# Altium footprint library Tomra_Cadstar_Footprints.PcbLib: 380 footprints (part 9 of 24)
Each footprint in its own frame and in the unit in brackets; x right, y up, seen from the top. Pads: shape width x height; smd on the part's side, far side on the other; paste and mask are expansions set on the pad; w line width, h text height; cw(c..) or ccw(c..) is an arc to the next point about the centre after c.
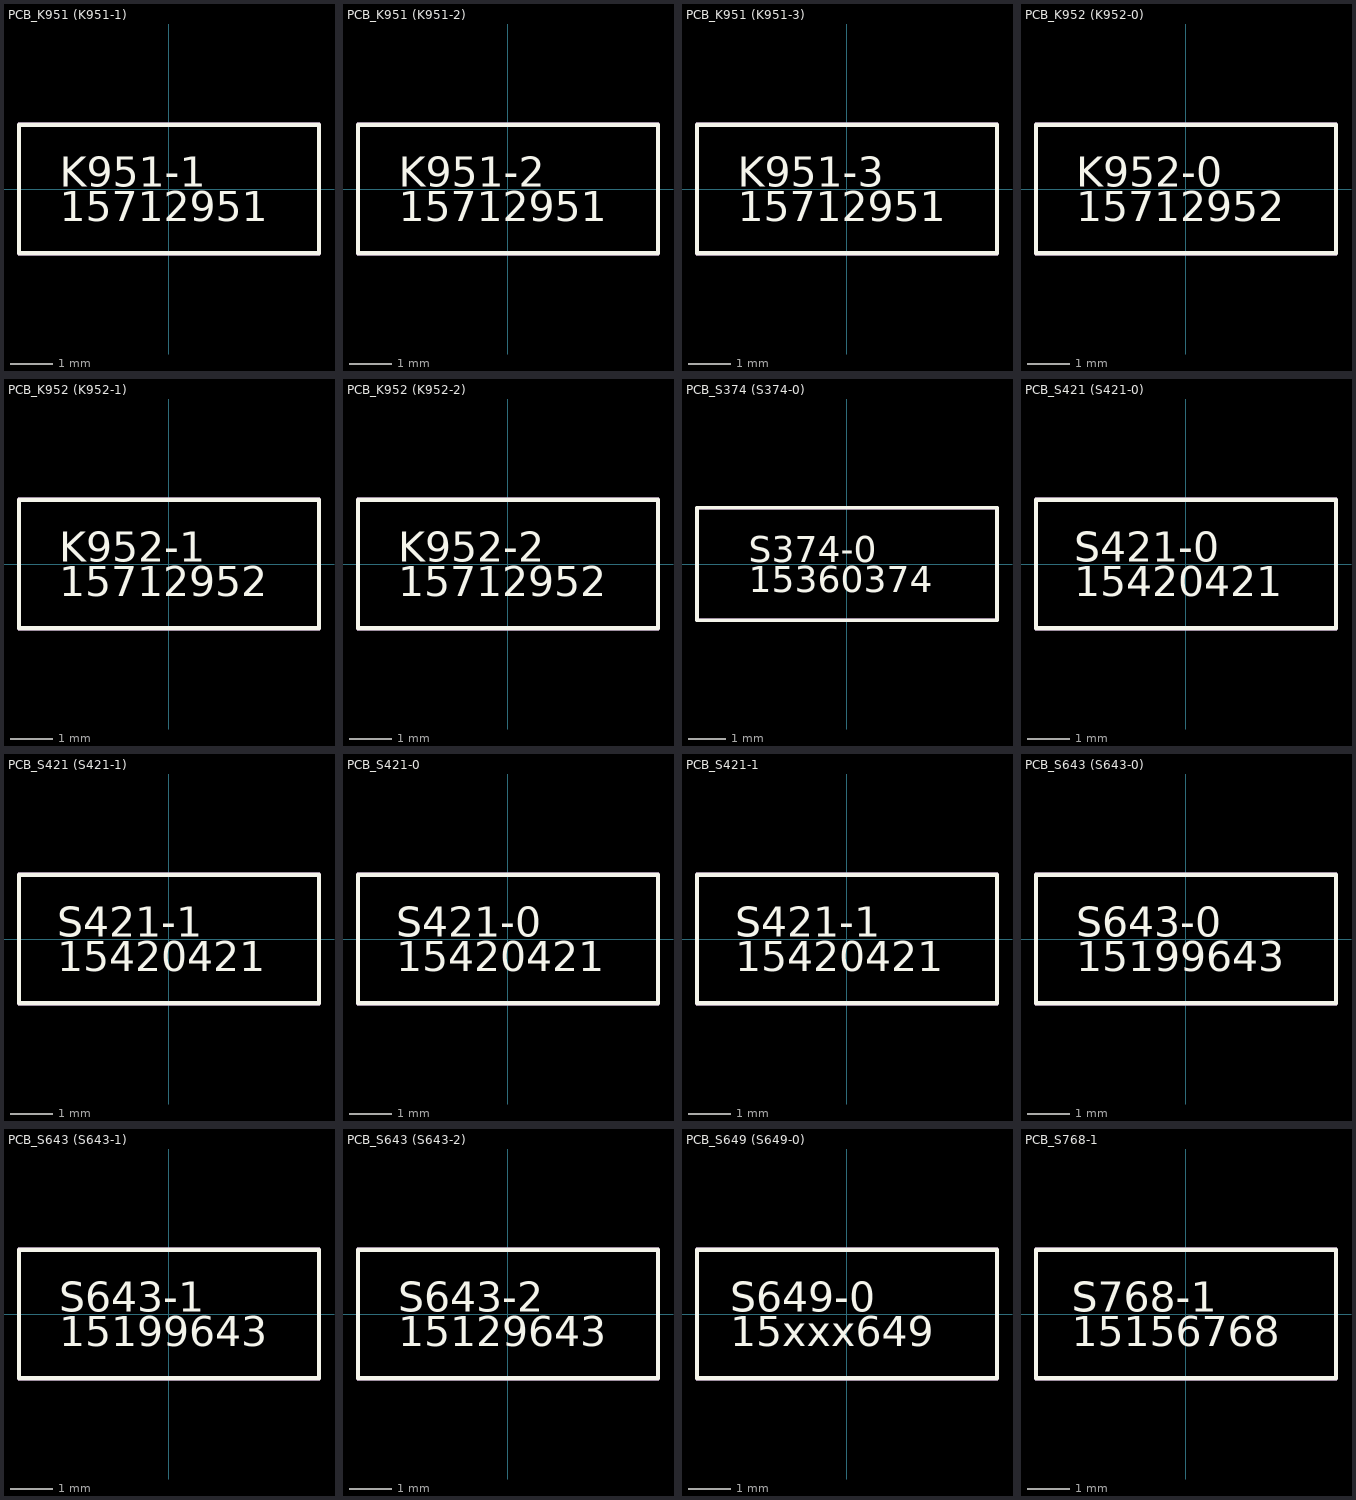
[diagram p8: the footprints below, top view; thin cyan lines are the x and y axes]

## PCB_K951 (K951-1) [mm]
height 0.1
Top Silk:
  lines w0.1: -3.5,-1.5 3.5,-1.5 3.5,1.5 -3.5,1.5 -3.5,-1.5
  text "15712951" at -2.549,-0.75 h0.7
  text "K951-1" at -2.549,0.05 h0.7
Top Placement:
  lines w0.1: -3.5,-1.5 3.5,-1.5 3.5,1.5 -3.5,1.5 -3.5,-1.5
  text "15712951" at -2.549,-0.75 h0.7
  text "K951-1" at -2.549,0.05 h0.7

## PCB_K951 (K951-2) [mm]
height 0.1
Top Silk:
  lines w0.1: -3.5,-1.5 3.5,-1.5 3.5,1.5 -3.5,1.5 -3.5,-1.5
  text "15712951" at -2.549,-0.75 h0.7
  text "K951-2" at -2.549,0.05 h0.7
Top Placement:
  lines w0.1: -3.5,-1.5 3.5,-1.5 3.5,1.5 -3.5,1.5 -3.5,-1.5
  text "15712951" at -2.549,-0.75 h0.7
  text "K951-2" at -2.549,0.05 h0.7

## PCB_K951 (K951-3) [mm]
height 0.1
Top Silk:
  lines w0.1: -3.5,-1.5 3.5,-1.5 3.5,1.5 -3.5,1.5 -3.5,-1.5
  text "15712951" at -2.549,-0.75 h0.7
  text "K951-3" at -2.549,0.05 h0.7
Top Placement:
  lines w0.1: -3.5,-1.5 3.5,-1.5 3.5,1.5 -3.5,1.5 -3.5,-1.5
  text "15712951" at -2.549,-0.75 h0.7
  text "K951-3" at -2.549,0.05 h0.7

## PCB_K952 (K952-0) [mm]
height 0.1
Top Silk:
  lines w0.1: -3.5,-1.5 3.5,-1.5 3.5,1.5 -3.5,1.5 -3.5,-1.5
  text "15712952" at -2.566,-0.75 h0.7
  text "K952-0" at -2.566,0.05 h0.7
Top Placement:
  lines w0.1: -3.5,-1.5 3.5,-1.5 3.5,1.5 -3.5,1.5 -3.5,-1.5
  text "15712952" at -2.566,-0.75 h0.7
  text "K952-0" at -2.566,0.05 h0.7

## PCB_K952 (K952-1) [mm]
height 0.1
Top Silk:
  lines w0.1: -3.5,-1.5 3.5,-1.5 3.5,1.5 -3.5,1.5 -3.5,-1.5
  text "15712952" at -2.566,-0.75 h0.7
  text "K952-1" at -2.566,0.05 h0.7
Top Placement:
  lines w0.1: -3.5,-1.5 3.5,-1.5 3.5,1.5 -3.5,1.5 -3.5,-1.5
  text "15712952" at -2.566,-0.75 h0.7
  text "K952-1" at -2.566,0.05 h0.7

## PCB_K952 (K952-2) [mm]
height 0.1
Top Silk:
  lines w0.1: -3.5,-1.5 3.5,-1.5 3.5,1.5 -3.5,1.5 -3.5,-1.5
  text "15712952" at -2.566,-0.75 h0.7
  text "K952-2" at -2.566,0.05 h0.7
Top Placement:
  lines w0.1: -3.5,-1.5 3.5,-1.5 3.5,1.5 -3.5,1.5 -3.5,-1.5
  text "15712952" at -2.566,-0.75 h0.7
  text "K952-2" at -2.566,0.05 h0.7

## PCB_S374 (S374-0) [mm]
height 0.1
Top Silk:
  lines w0.1: -4,-1.5 4,-1.5 4,1.5 -4,1.5 -4,-1.5
  text "15360374" at -2.624,-0.75 h0.7
  text "S374-0" at -2.624,0.05 h0.7
Top Placement:
  lines w0.1: -4,-1.5 4,-1.5 4,1.5 -4,1.5 -4,-1.5
  text "15360374" at -2.624,-0.75 h0.7
  text "S374-0" at -2.624,0.05 h0.7

## PCB_S421 (S421-0) [mm]
height 0.1
Top Silk:
  lines w0.1: -3.5,-1.5 3.5,-1.5 3.5,1.5 -3.5,1.5 -3.5,-1.5
  text "15420421" at -2.608,-0.75 h0.7
  text "S421-0" at -2.608,0.05 h0.7
Top Placement:
  lines w0.1: -3.5,-1.5 3.5,-1.5 3.5,1.5 -3.5,1.5 -3.5,-1.5
  text "15420421" at -2.608,-0.75 h0.7
  text "S421-0" at -2.608,0.05 h0.7

## PCB_S421 (S421-1) [mm]
height 0.1
Top Silk:
  lines w0.1: -3.5,-1.5 3.5,-1.5 3.5,1.5 -3.5,1.5 -3.5,-1.5
  text "15420421" at -2.608,-0.75 h0.7
  text "S421-1" at -2.608,0.05 h0.7
Top Placement:
  lines w0.1: -3.5,-1.5 3.5,-1.5 3.5,1.5 -3.5,1.5 -3.5,-1.5
  text "15420421" at -2.608,-0.75 h0.7
  text "S421-1" at -2.608,0.05 h0.7

## PCB_S421-0 [mm]
height 0.1
Top Silk:
  lines w0.1: -3.5,-1.5 3.5,-1.5 3.5,1.5 -3.5,1.5 -3.5,-1.5
  text "15420421" at -2.608,-0.75 h0.7
  text "S421-0" at -2.608,0.05 h0.7
Top Placement:
  lines w0.1: -3.5,-1.5 3.5,-1.5 3.5,1.5 -3.5,1.5 -3.5,-1.5
  text "15420421" at -2.608,-0.75 h0.7
  text "S421-0" at -2.608,0.05 h0.7

## PCB_S421-1 [mm]
height 0.1
Top Silk:
  lines w0.1: -3.5,-1.5 3.5,-1.5 3.5,1.5 -3.5,1.5 -3.5,-1.5
  text "15420421" at -2.608,-0.75 h0.7
  text "S421-1" at -2.608,0.05 h0.7
Top Placement:
  lines w0.1: -3.5,-1.5 3.5,-1.5 3.5,1.5 -3.5,1.5 -3.5,-1.5
  text "15420421" at -2.608,-0.75 h0.7
  text "S421-1" at -2.608,0.05 h0.7

## PCB_S643 (S643-0) [mm]
height 0.1
Top Silk:
  lines w0.1: -3.5,-1.5 3.5,-1.5 3.5,1.5 -3.5,1.5 -3.5,-1.5
  text "15199643" at -2.566,-0.75 h0.7
  text "S643-0" at -2.566,0.05 h0.7
Top Placement:
  lines w0.1: -3.5,-1.5 3.5,-1.5 3.5,1.5 -3.5,1.5 -3.5,-1.5
  text "15199643" at -2.566,-0.75 h0.7
  text "S643-0" at -2.566,0.05 h0.7

## PCB_S643 (S643-1) [mm]
height 0.1
Top Silk:
  lines w0.1: -3.5,-1.5 3.5,-1.5 3.5,1.5 -3.5,1.5 -3.5,-1.5
  text "15199643" at -2.566,-0.75 h0.7
  text "S643-1" at -2.566,0.05 h0.7
Top Placement:
  lines w0.1: -3.5,-1.5 3.5,-1.5 3.5,1.5 -3.5,1.5 -3.5,-1.5
  text "15199643" at -2.566,-0.75 h0.7
  text "S643-1" at -2.566,0.05 h0.7

## PCB_S643 (S643-2) [mm]
height 0.1
Top Silk:
  lines w0.1: -3.5,-1.5 3.5,-1.5 3.5,1.5 -3.5,1.5 -3.5,-1.5
  text "15129643" at -2.566,-0.75 h0.7
  text "S643-2" at -2.566,0.05 h0.7
Top Placement:
  lines w0.1: -3.5,-1.5 3.5,-1.5 3.5,1.5 -3.5,1.5 -3.5,-1.5
  text "15129643" at -2.566,-0.75 h0.7
  text "S643-2" at -2.566,0.05 h0.7

## PCB_S649 (S649-0) [mm]
height 0.1
Top Silk:
  lines w0.1: -3.5,-1.5 3.5,-1.5 3.5,1.5 -3.5,1.5 -3.5,-1.5
  text "15xxx649" at -2.724,-0.75 h0.7
  text "S649-0" at -2.724,0.05 h0.7
Top Placement:
  lines w0.1: -3.5,-1.5 3.5,-1.5 3.5,1.5 -3.5,1.5 -3.5,-1.5
  text "15xxx649" at -2.724,-0.75 h0.7
  text "S649-0" at -2.724,0.05 h0.7

## PCB_S768-1 [mm]
height 0.1
Top Silk:
  lines w0.1: -3.5,-1.5 3.5,-1.5 3.5,1.5 -3.5,1.5 -3.5,-1.5
  text "15156768" at -2.666,-0.75 h0.7
  text "S768-1" at -2.666,0.05 h0.7
Top Placement:
  lines w0.1: -3.5,-1.5 3.5,-1.5 3.5,1.5 -3.5,1.5 -3.5,-1.5
  text "15156768" at -2.666,-0.75 h0.7
  text "S768-1" at -2.666,0.05 h0.7